# Altium footprint library Library 3D.PcbLib: 288 footprints (part 18 of 18)
Each footprint in its own frame and in the unit in brackets; x right, y up, seen from the top. Pads: shape width x height; smd on the part's side, far side on the other; paste and mask are expansions set on the pad; w line width, h text height; cw(c..) or ccw(c..) is an arc to the next point about the centre after c.
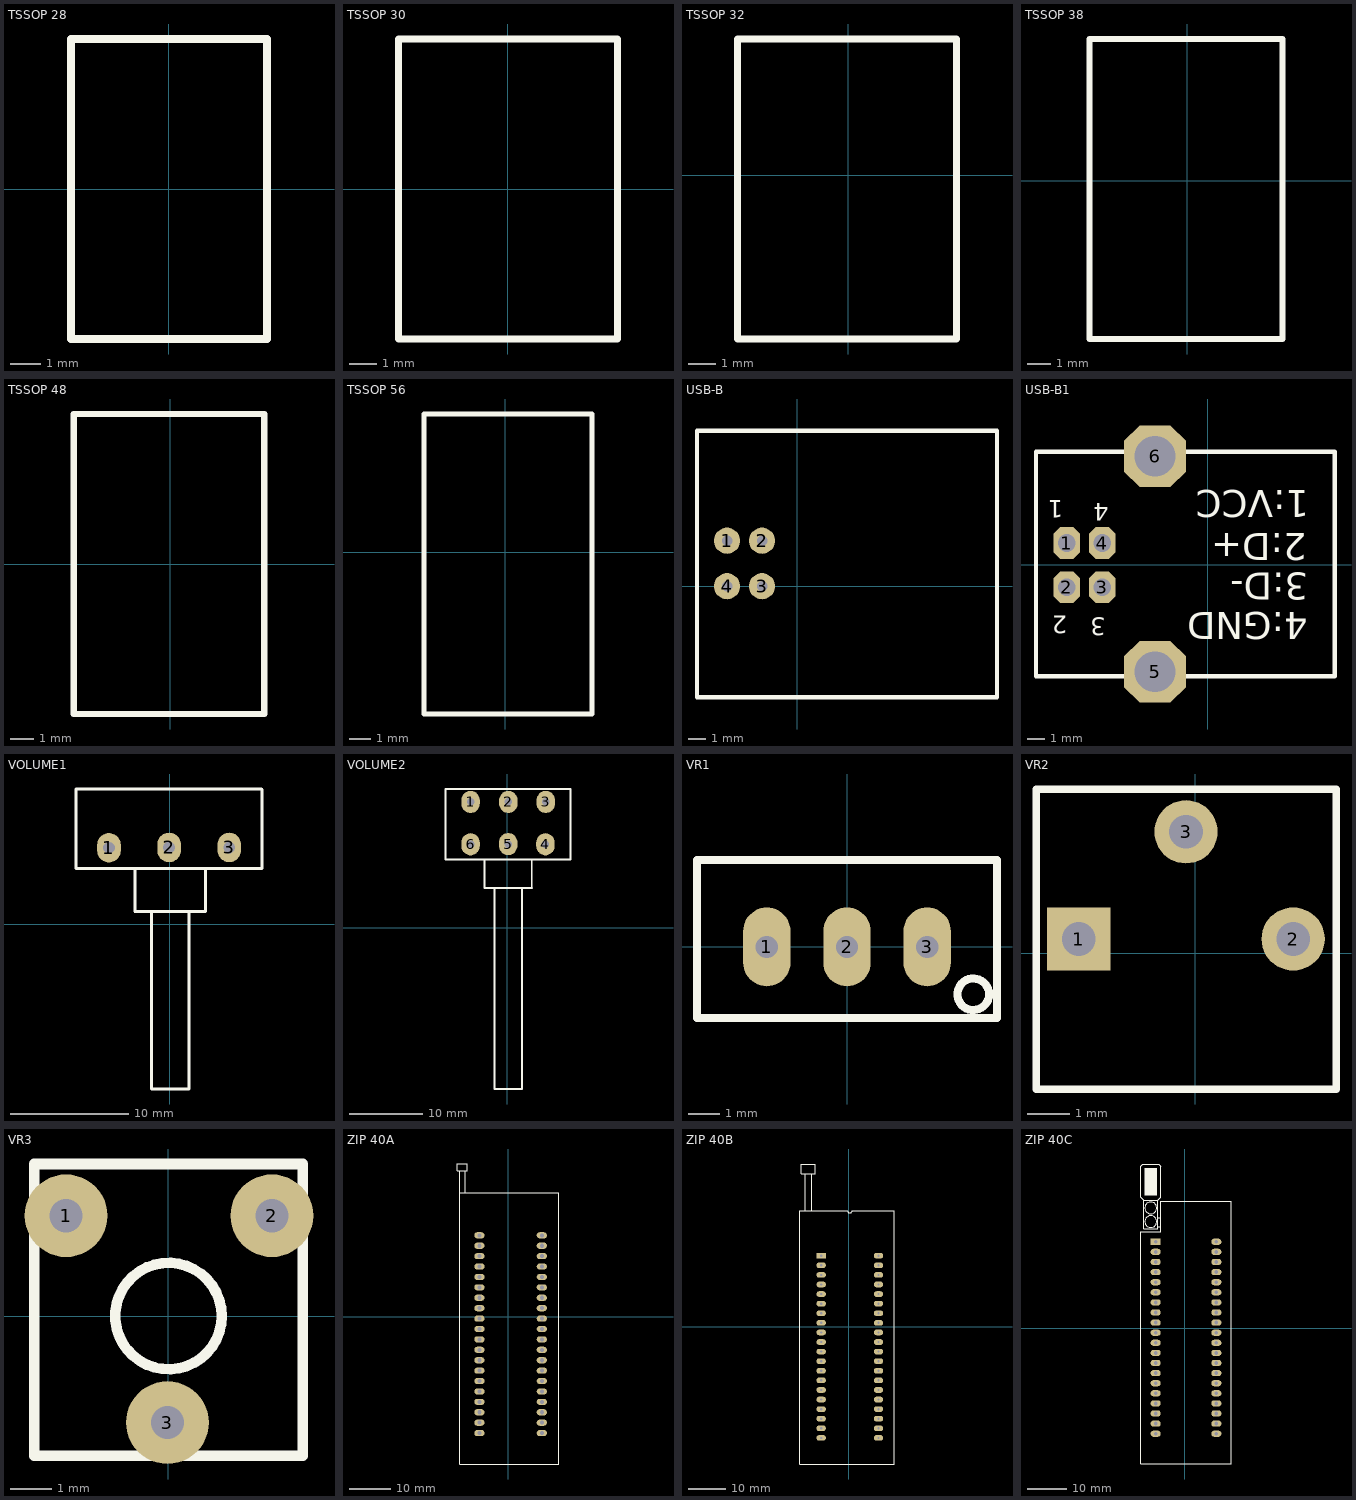
[diagram p17: the footprints below, top view; thin cyan lines are the x and y axes]

## TSSOP 28 [mm]
Top Overlay:
  lines w0.254: -3.2,-4.9 -3.2,4.9 3.2,4.9 3.2,-4.9 -3.2,-4.9
3D body "User Library-TSSOP-28 9_8x4_4.STEP": height 0.5, standoff -0.6, extent -3.2,-4.9 3.2,4.9

## TSSOP 30 [mm]
Top Overlay:
  lines w0.254: -4.05,-5.55 -4.05,5.55 4.05,5.55 4.05,-5.55 -4.05,-5.55
3D body "User Library-TSSOP-30 11_1x6_2.STEP": height 0.5, standoff -0.6, extent -4.05,-5.55 4.05,5.55

## TSSOP 32 [mm]
Top Overlay:
  lines w0.254: -4.1,-6.05 -4.1,5.05 4,5.05 4,-6.05 -4.1,-6.05
3D body "User Library-TSSOP-32 11_1x6_2.STEP": height 0.5, standoff -0.6, extent -4.1,-6.05 4,5.05

## TSSOP 38 [mm]
Top Overlay:
  lines w0.254: -4.1,-6.65 -4.1,5.95 4,5.95 4,-6.65 -4.1,-6.65
3D body "User Library-TSSOP-38 12_6x6_2.STEP": height 0.5, standoff -0.6, extent -4.1,-6.65 4,5.95

## TSSOP 48 [mm]
Top Overlay:
  lines w0.254: -4.05,-6.3 -4.05,6.3 3.95,6.3 3.95,-6.3 -4.05,-6.3
3D body "User Library-TSSOP-48 12_6x6_2.STEP": height 0.5, standoff -0.6, extent -4.05,-6.3 3.95,6.3

## TSSOP 56 [mm]
Top Overlay:
  lines w0.254: -3.825,-7.6 -3.825,6.5 4.075,6.5 4.075,-7.6 -3.825,-7.6
3D body "User Library-TSSOP-56 14_1x6_2.STEP": height 0.5, standoff -0.6, extent -3.825,-7.6 4.075,6.5

## USB-B [mm]
pads (4):
  round 1.5 hole 0.6: 1(-4,2.6) 2(-2,2.6) 3(-2,0) 4(-4,0)
Top Overlay:
  lines w0.254: -5.715,-6.35 11.43,-6.35 11.43,8.89 -5.715,8.89 -5.715,-6.35
3D body "User Library-Samtec - USB-B-S-X-W-TH.STEP": height 11, standoff -3.64, extent -5.461,-6.034 11.039,8.763

## USB-B1 [mm]
pads (6):
  oct 1.5x1.8 hole 1: 1(-7.958,1.22) 2(-7.958,-1.28) 3(-5.958,-1.28) 4(-5.958,1.22)
  oct 3.5x3.5 hole 2.3: 5(-2.97,-6.063) 6(-2.97,6.129)
Top Overlay:
  lines w0.254: -9.701,-6.317 7.19,-6.317 7.19,6.383 -9.701,6.383 -9.701,-6.317
  text "1:VCC" at 5.743,4.198 h1.52
  text "2:D+" at 5.616,1.785 h1.52
  text "3:D-" at 5.692,-0.475 h1.52
  text "4:GND" at 5.666,-2.685 h1.52
  text "1" at -8.151,3.64 h1
  text "3" at -5.764,-3.015 h1
  text "2" at -7.923,-2.888 h1
  text "4" at -5.586,3.462 h1
3D body "Samtec-USB-B-S-F-B-TH-Strange.step": height 10.98, standoff -3.24, extent -8.808,-7.46 7.492,7.399

## VOLUME1 [mm]
pads (3):
  oval 2x2.5 hole 1: 1(-5.15,6.5) 2(-0.05,6.525) 3(5.05,6.525)
Top Overlay:
  lines w0.254: -2.95,4.725 -2.95,1.1 -2.925,1.075 3.05,1.075 3.05,4.725 ; -1.55,1.075 -1.55,-13.95 1.625,-13.95 1.625,1.025 ; -7.925,4.725 -7.925,11.479 7.777,11.479 7.8,11.456 7.8,4.725 -7.925,4.725
3D body "SW3dPS-Pot.STEP": height 21.32, standoff -3.3, extent -7.925,-14.079 7.823,11.479

## VOLUME2 [mm]
pads (6):
  oval 2.5x3 hole 1: 1(-4.95,17.075) 2(0.175,17.075) 3(5.25,17.075) 4(5.2,11.325) 5(0.15,11.35) 6(-4.95,11.325)
Top Overlay:
  lines w0.254: -3.075,5.375 3.375,5.375 ; -3.075,5.4 -3.075,9.225 ; -1.725,5.3 -1.725,-21.875 2,-21.875 2,5.3 ; 3.35,5.375 3.35,9.25 ; -8.375,9.25 -8.35,9.275 8.625,9.275 8.625,18.825 -8.375,18.825 -8.375,9.25
3D body "SW3dPS-ALPHA-potentiometer stereo PCB mount.STEP": height 21.2, standoff -3.3, extent -8.375,-22.025 8.625,18.825

## VR1 [mm]
pads (3):
  oval 1.5x2.5 hole 0.7: 1(-2.54,0) 2(0,0) 3(2.54,0)
Top Overlay:
  circle w0.254: c4,-1.5 r0.5
  lines w0.254: -4.75,-2.25 4.75,-2.25 4.75,2.75 -4.75,2.75 -4.75,-2.25
3D body "VR.STEP": height 11.7, standoff -10.3, extent -4.5,-2.1 4.5,2.6

## VR2 [mm]
pads (3):
  rect 1.5x1.5 hole 0.8: 1(-2.76,0.339)
  round 1.5 hole 0.8: 2(2.32,0.339) 3(-0.22,2.879)
Top Overlay:
  lines w0.178: -3.776,-3.217 -3.776,3.895 -3.649,3.895 3.082,3.895 3.336,3.895 3.336,-3.217 -3.776,-3.217
3D body "SW3dPS-3362P-1-102LF.STEP": height 4.4, standoff -3, extent -3.52,-2.961 3.08,3.639

## VR3 [mm]
pads (3):
  round 2 hole 0.8: 1(-2.475,2.425) 2(2.5,2.425) 3(-0.025,-2.575)
Top Overlay:
  circle w0.254: c0,0 r1.287
  lines w0.254: -3.25,-3.375 -3.25,3.675 3.25,3.675 3.25,-3.375 -3.25,-3.375
3D body "User Library-Pot - RES_VAR1.STEP": height 7.5, standoff -3.4, extent -3.25,-3.375 3.25,3.675

## ZIP 40A [mm]
pads (40):
  oval 2.5x1.5 hole 1: 1(-7,19.875) 2(-7,17.335) 3(-7,14.795) 4(-7,12.255) 5(-7,9.715) 6(-7,7.175) 7(-7,4.635) 8(-7,2.095) 9(-7,-0.445) 10(-7,-2.985) 11(-7,-5.525) 12(-7,-8.065) 13(-7,-10.605) 14(-7,-13.145) 15(-7,-15.685) 16(-7,-18.225) 17(-7,-20.765) 18(-7,-23.305) 19(-7,-25.845) 20(-7,-28.385) 21(8.225,-28.385) 22(8.225,-25.845) 23(8.225,-23.305) 24(8.225,-20.765) 25(8.225,-18.225) 26(8.225,-15.685) 27(8.225,-13.145) 28(8.225,-10.605) 29(8.225,-8.065) 30(8.225,-5.525) 31(8.225,-2.985) 32(8.225,-0.445) 33(8.225,2.095) 34(8.225,4.635) 35(8.225,7.175) 36(8.225,9.715) 37(8.225,12.255) 38(8.225,14.795) 39(8.225,17.335) 40(8.225,19.875)
Top Overlay:
  lines w0.254: -11.8,35.65 -11.8,30.25 ; -10.4,30.225 -10.4,35.675 ; -11.8,30.25 12.3,30.25 12.3,-35.925 -11.8,-35.925 -11.8,30.25 ; -12.35,35.675 -11.825,35.675 -10.425,35.675 -9.975,35.675 -9.925,35.725 -9.925,37.275 -10.4,37.275 -12.309,37.275 -12.35,37.275 -12.35,35.675
3D body "User Library-Zif-Zip Socket.STEP": height 21.35, standoff -3.13, extent -12.363,-35.725 12.113,37.329

## ZIP 40B [mm]
pads (40):
  rect 2.5x1.5 hole 0.6: 1(-7.275,18.85)
  oval 2.5x1.5 hole 0.6: 2(-7.275,16.31) 3(-7.275,13.77) 4(-7.275,11.23) 5(-7.275,8.69) 6(-7.275,6.15) 7(-7.275,3.61) 8(-7.275,1.07) 9(-7.275,-1.47) 10(-7.275,-4.01) 11(-7.275,-6.55) 12(-7.275,-9.09) 13(-7.275,-11.63) 14(-7.275,-14.17) 15(-7.275,-16.71) 16(-7.275,-19.25) 17(-7.275,-21.79) 18(-7.275,-24.33) 19(-7.275,-26.87) 20(-7.275,-29.41) 21(7.925,-29.41) 22(7.925,-26.87) 23(7.925,-24.33) 24(7.925,-21.79) 25(7.925,-19.25) 26(7.925,-16.71) 27(7.925,-14.17) 28(7.925,-11.63) 29(7.925,-9.09) 30(7.925,-6.55) 31(7.925,-4.01) 32(7.925,-1.47) 33(7.925,1.07) 34(7.925,3.61) 35(7.925,6.15) 36(7.925,8.69) 37(7.925,11.23) 38(7.925,13.77) 39(7.925,16.31) 40(7.925,18.85)
Top Overlay:
  lines w0.2: -0.32,30.825 ccw(c0.315,30.825) 0.95,30.825 ; -0.31,30.825 -12.925,30.825 -12.925,-36.325 12.075,-36.325 12.075,30.825 0.96,30.825
  lines w0.254: -11.875,40.625 -11.075,40.625 -8.8,40.625 -8.8,43.15 -10.05,43.15 -12.55,43.15 -12.55,40.625 -11.55,40.625 -11.55,30.875 ; -9.8,30.85 -9.8,40.625
3D body "User Library-DIP40 active.STEP": height 13.2, standoff -3.2, extent -12.649,-35.975 11.699,43.225

## ZIP 40C [mil]
pads (40):
  rect 100x62 hole 38: 1(-288.98,857.36)
  oval 100x62 hole 38: 2(-288.98,757.36) 3(-288.98,657.36) 4(-288.98,557.36) 5(-288.98,457.36) 6(-288.98,357.36) 7(-288.98,257.36) 8(-288.98,157.36) 9(-288.98,57.36) 10(-288.98,-42.64) 11(-288.98,-142.64) 12(-288.98,-242.64) 13(-288.98,-342.64) 14(-288.98,-442.64) 15(-288.98,-542.64) 16(-288.98,-642.64) 17(-288.98,-742.64) 18(-288.98,-842.64) 19(-288.98,-942.64) 20(-288.98,-1042.64) 21(311.02,-1042.64) 22(311.02,-942.64) 23(311.02,-842.64) 24(311.02,-742.64) 25(311.02,-642.64) 26(311.02,-542.64) 27(311.02,-442.64) 28(311.02,-342.64) 29(311.02,-242.64) 30(311.02,-142.64) 31(311.02,-42.64) 32(311.02,57.36) 33(311.02,157.36) 34(311.02,257.36) 35(311.02,357.36) 36(311.02,457.36) 37(311.02,557.36) 38(311.02,657.36) 39(311.02,757.36) 40(311.02,857.36)
Top Overlay:
  circle w7: c-337.29,1192.36 r58.31
  circle w7: c-337.29,1057.36 r58.31
  rectangle: -398.98,1317.36 -273.98,1587.36
  lines w7: -268.98,1007.36 -238.98,1007.36 ; -268.98,1097.36 -238.98,1097.36 ; -408.98,1267.36 -408.98,987.36 -398.98,987.36 -268.98,987.36 -268.98,1267.36 ; -408.98,1267.36 -438.98,1297.36 -438.98,1607.36 -418.98,1627.36 -258.98,1627.36 -238.98,1607.36 -238.98,1297.36 -268.98,1267.36 ; -408.98,1267.36 -268.98,1267.36 ; -438.98,-1342.64 -438.98,957.36 -238.98,957.36 -238.98,1257.36 311.02,1257.36 461.02,1257.36 461.02,-1342.64 -438.98,-1342.64
3D body "SW3dPS-zif.STEP": height 443.07, standoff -186.85, extent -478.58,-1287.15 461.02,1751.87